# Altium footprint library PCB_Footprints.PcbLib: 303 footprints (part 4 of 19)
Each footprint in its own frame and in the unit in brackets; x right, y up, seen from the top. Pads: shape width x height; smd on the part's side, far side on the other; paste and mask are expansions set on the pad; w line width, h text height; cw(c..) or ccw(c..) is an arc to the next point about the centre after c.
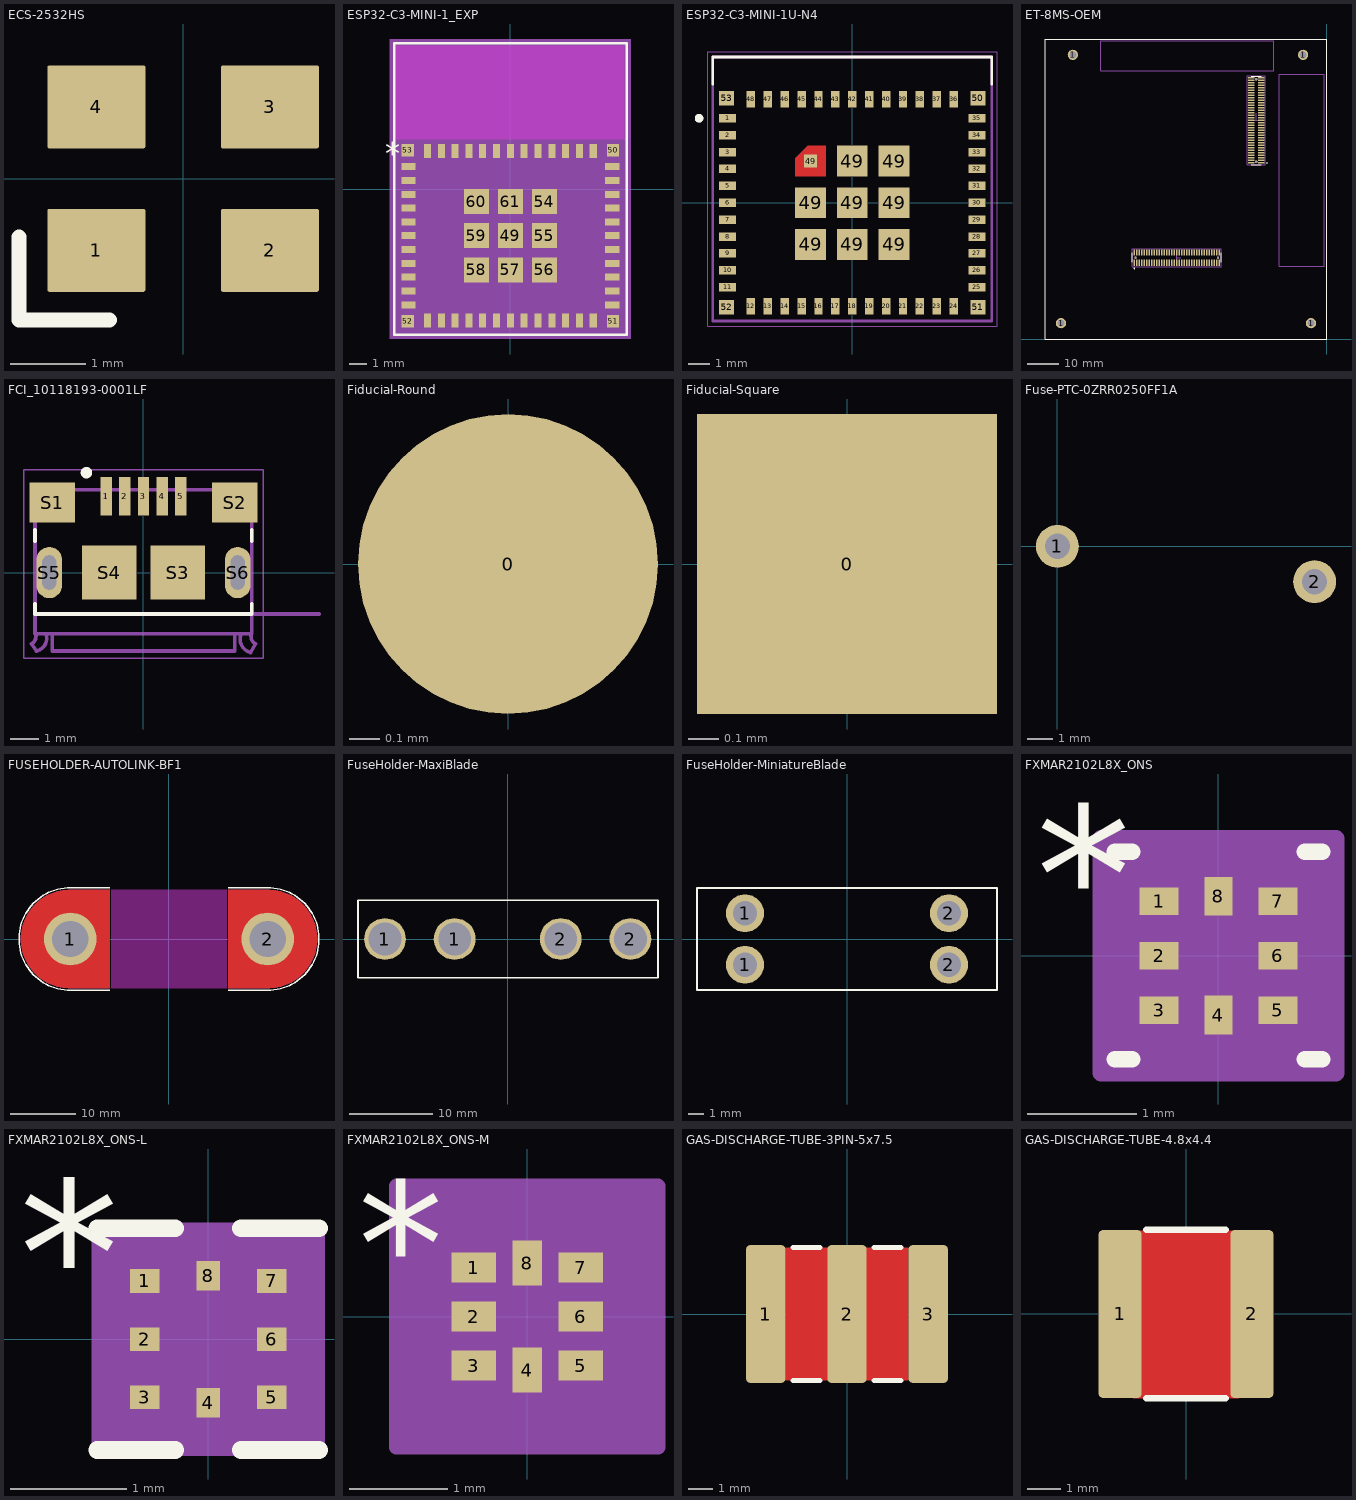
[diagram p3: the footprints below, top view; thin cyan lines are the x and y axes]

## ECS-2532HS [mm] "ECS-2532HS OSCILLATOR 3.2x2.5mm, from ECS model 2532HS datasheet"
height 1
pads (4):
  rrect5% 1.3x1.1 smd: 1(-1.15,-0.95) 2(1.15,-0.95) 3(1.15,0.95) 4(-1.15,0.95)
Top Overlay:
  lines w0.2: -2.175,-0.775 -2.175,-1.875 -0.975,-1.875
3D body: height 0.8, standoff 0.1, extent -1.6,-1.25 1.6,1.25

## ESP32-C3-MINI-1_EXP [mil]
pads (61):
  rect 32x16 smd paste+0 mask+0: 1(-232.28,50.98) 2(-232.28,19.48) 3(-232.28,-12.01) 4(-232.28,-43.51) 5(-232.28,-75) 6(-232.28,-106.5) 7(-232.28,-138) 8(-232.28,-169.49) 9(-232.28,-200.99) 10(-232.28,-232.48) 11(-232.28,-263.98) 25(232.28,-263.98) 26(232.28,-232.48) 27(232.28,-200.99) 28(232.28,-169.49) 29(232.28,-138) 30(232.28,-106.5) 31(232.28,-75) 32(232.28,-43.51) 33(232.28,-12.01) 34(232.28,19.48) 35(232.28,50.98)
  rect 16x32 smd paste+0 mask+0: 12(-188.98,-299.41) 13(-157.48,-299.41) 14(-125.98,-299.41) 15(-94.49,-299.41) 16(-62.99,-299.41) 17(-31.5,-299.41) 18(0,-299.41) 19(31.5,-299.41) 20(62.99,-299.41) 21(94.49,-299.41) 22(125.98,-299.41) 23(157.48,-299.41) 24(188.98,-299.41) 36(188.98,86.41) 37(157.48,86.41) 38(125.98,86.41) 39(94.49,86.41) 40(62.99,86.41) 41(31.5,86.41) 42(0,86.41) 43(-31.5,86.41) 44(-62.99,86.41) 45(-94.49,86.41) 46(-125.98,86.41) 47(-157.48,86.41) 48(-188.98,86.41)
  rect 57x57 smd: 49(0,-106.5) 54(77.76,-28.74) 55(77.76,-106.5) 56(77.76,-184.26) 57(0,-184.26) 58(-77.76,-184.26) 59(-77.76,-106.5) 60(-77.76,-28.74) 61(0,-28.74)
  rect 28x28 smd: 50(234.25,88.38) 51(234.25,-301.38) 52(-234.25,-301.38) 53(-234.25,88.38)
Top Overlay:
  lines w6: -265,-332 -265,332 265,332 265,-332 -265,-332
  text "*" at -285.78,56.73 h50
Keep-Out Layer:
  region: 260,327 -260,327 -260,114 260,114
Bottom 3D Body (Mech5):
  region: 275,342 -275,342 -275,-342 275,-342
Mechanical 13:
  lines w1: -260,-327 -260,327 260,327 260,-327 -260,-327
  text "*" at -218.78,41.73 h50
Mechanical 15:
  region: 270,337 -270,337 -270,-337 270,-337
  lines w6: -270,-337 -270,337 270,337 270,-337 -270,-337
3D body: height 10, standoff 0, extent 0,0 10,10
3D body "ESP32-C3-MINI.STEP": height 100.39, standoff 0, extent -258.86,-326.77 260.83,326.77

## ESP32-C3-MINI-1U-N4 [mm]
height 2.55
pads (61):
  rect 0.8x0.4 smd: 1(-5.9,4) 2(-5.9,3.2) 3(-5.9,2.4) 4(-5.9,1.6) 5(-5.9,0.8) 6(-5.9,0) 7(-5.9,-0.8) 8(-5.9,-1.6) 9(-5.9,-2.4) 10(-5.9,-3.2) 11(-5.9,-4) 25(5.9,-4) 26(5.9,-3.2) 27(5.9,-2.4) 28(5.9,-1.6) 29(5.9,-0.8) 30(5.9,0) 31(5.9,0.8) 32(5.9,1.6) 33(5.9,2.4) 34(5.9,3.2) 35(5.9,4)
  rect 0.4x0.8 smd: 12(-4.8,-4.9) 13(-4,-4.9) 14(-3.2,-4.9) 15(-2.4,-4.9) 16(-1.6,-4.9) 17(-0.8,-4.9) 18(0,-4.9) 19(0.8,-4.9) 20(1.6,-4.9) 21(2.4,-4.9) 22(3.2,-4.9) 23(4,-4.9) 24(4.8,-4.9) 36(4.8,4.9) 37(4,4.9) 38(3.2,4.9) 39(2.4,4.9) 40(1.6,4.9) 41(0.8,4.9) 42(0,4.9) 43(-0.8,4.9) 44(-1.6,4.9) 45(-2.4,4.9) 46(-3.2,4.9) 47(-4,4.9) 48(-4.8,4.9)
  rect 1.45x1.45 smd: 49(-1.975,-1.975) 49(-1.975,0) 49(0,-1.975) 49(0,0) 49(0,1.975) 49(1.975,-1.975) 49(1.975,0) 49(1.975,1.975)
  rect 0.6x0.6 smd paste-1 mask+0: 49(-1.975,1.975)
  rect 0.7x0.7 smd: 50(5.95,4.95) 51(5.95,-4.95) 52(-5.95,-4.95) 53(-5.95,4.95)
Top Layer:
  region: -1.25,1.25 -2.7,1.25 -2.7,2.1 -2.1,2.7 -1.25,2.7
Top Overlay:
  circle w0.2: c-7.25,4 r0.1
  lines w0.127: -6.6,5.62 -6.6,6.9 6.6,6.9 6.6,5.62
Top Paste:
  region: -1.25,1.25 -2.7,1.25 -2.7,2.1 -2.1,2.7 -1.25,2.7
Top Solder:
  region: -1.15,1.15 -2.8,1.15 -2.8,2.14 -2.14,2.8 -1.15,2.8
Mechanical 13:
  circle w0.2: c-7.25,4 r0.1
  lines w0.127: -6.6,-5.6 -6.6,6.9 6.6,6.9 6.6,-5.6 -6.6,-5.6
Mechanical 15:
  lines w0.05: -6.85,-5.85 6.85,-5.85 6.85,7.15 -6.85,7.15 -6.85,-5.85
3D body "step_temp.STEP": height 2.55, standoff 0, extent -6.6,-5.6 6.6,6.9

## ET-8MS-OEM [mm] "Switch Ethernet pour boite de jct ichtyos"
pads (148):
  round 3.302 hole 2.286: 1(-85.09,5.08) 1(-81.28,90.932) 1(-7.62,90.932) 1(-5.08,5.08)
  rect 2.03x0.508 smd: 1A(-20.956,83.552) 2A(-24.256,83.552) 3A(-20.956,82.752) 4A(-24.256,82.752) 5A(-20.956,81.952) 6A(-24.256,81.952) 7A(-20.956,81.152) 8A(-24.256,81.152) 9A(-20.956,80.352) 10A(-24.256,80.352) 11A(-20.956,79.552) 12A(-24.256,79.552) 13A(-20.956,78.752) 14A(-24.256,78.752) 15A(-20.956,77.952) 16A(-24.256,77.952) 17A(-20.956,77.152) 18A(-24.256,77.152) 19A(-20.956,76.352) 20A(-24.256,76.352) 21A(-20.956,75.552) 22A(-24.256,75.552) 23A(-20.956,74.752) 24A(-24.256,74.752) 25A(-20.956,73.952) 26A(-24.256,73.952) 27A(-20.956,73.152) 28A(-24.256,73.152) 29A(-20.956,72.352) 30A(-24.256,72.352) 31A(-20.956,71.552) 32A(-24.256,71.552) 33A(-20.956,70.752) 34A(-24.256,70.752) 35A(-20.956,69.952) 36A(-24.256,69.952) 37A(-20.956,69.152) 38A(-24.256,69.152) 39A(-20.956,68.352) 40A(-24.256,68.352) 41A(-20.956,67.552) 42A(-24.256,67.552) 43A(-20.956,66.752) 44A(-24.256,66.752) 45A(-20.956,65.952) 46A(-24.256,65.952) 47A(-20.956,65.152) 48A(-24.256,65.152) 49A(-20.956,64.352) 50A(-24.256,64.352) 51A(-20.956,63.552) 52A(-24.256,63.552) 53A(-20.956,62.752) 54A(-24.256,62.752) 55A(-20.956,61.952) 56A(-24.256,61.952) 57A(-20.956,61.152) 58A(-24.256,61.152) 59A(-20.956,60.352) 60A(-24.256,60.352) 61A(-20.956,59.552) 62A(-24.256,59.552) 63A(-20.956,58.752) 64A(-24.256,58.752) 65A(-20.956,57.952) 66A(-24.256,57.952) 67A(-20.956,57.152) 68A(-24.256,57.152) 69A(-20.956,56.352) 70A(-24.256,56.352)
  rect 0.508x2.03 smd: 1B(-34.431,24.385) 2B(-34.431,27.685) 3B(-35.231,24.385) 4B(-35.231,27.685) 5B(-36.031,24.385) 6B(-36.031,27.685) 7B(-36.831,24.385) 8B(-36.831,27.685) 9B(-37.631,24.385) 10B(-37.631,27.685) 11B(-38.431,24.385) 12B(-38.431,27.685) 13B(-39.231,24.385) 14B(-39.231,27.685) 15B(-40.031,24.385) 16B(-40.031,27.685) 17B(-40.831,24.385) 18B(-40.831,27.685) 19B(-41.631,24.385) 20B(-41.631,27.685) 21B(-42.431,24.385) 22B(-42.431,27.685) 23B(-43.231,24.385) 24B(-43.231,27.685) 25B(-44.031,24.385) 26B(-44.031,27.685) 27B(-44.831,24.385) 28B(-44.831,27.685) 29B(-45.631,24.385) 30B(-45.631,27.685) 31B(-46.431,24.385) 32B(-46.431,27.685) 33B(-47.231,24.385) 34B(-47.231,27.685) 35B(-48.031,24.385) 36B(-48.031,27.685) 37B(-48.831,24.385) 38B(-48.831,27.685) 39B(-49.631,24.385) 40B(-49.631,27.685) 41B(-50.431,24.385) 42B(-50.431,27.685) 43B(-51.231,24.385) 44B(-51.231,27.685) 45B(-52.031,24.385) 46B(-52.031,27.685) 47B(-52.831,24.385) 48B(-52.831,27.685) 49B(-53.631,24.385) 50B(-53.631,27.685) 51B(-54.431,24.385) 52B(-54.431,27.685) 53B(-55.231,24.385) 54B(-55.231,27.685) 55B(-56.031,24.385) 56B(-56.031,27.685) 57B(-56.831,24.385) 58B(-56.831,27.685) 59B(-57.631,24.385) 60B(-57.631,27.685) 61B(-58.431,24.385) 62B(-58.431,27.685) 63B(-59.231,24.385) 64B(-59.231,27.685) 65B(-60.031,24.385) 66B(-60.031,27.685) 67B(-60.831,24.385) 68B(-60.831,27.685) 69B(-61.631,24.385) 70B(-61.631,27.685)
  round 0.76 hole 0.76 unplated: ""(-61.231,26.035) ""(-34.831,26.035) ""(-22.606,56.752) ""(-22.606,83.152)
Top Overlay:
  circle w0.2: c-61.631,22.61 r0.1
  circle w0.2: c-19.181,56.352 r0.1
  lines w0.2: -62.235,24.511 -62.235,27.559 ; -33.827,24.511 -33.827,27.559 ; -24.13,55.748 -21.082,55.748 ; -24.13,84.156 -21.082,84.156
  lines w0.254: -90.17,0 0,0 0,96.012 -90.17,96.012 -90.17,0
Information:
  lines w0.254: -48.031,24.385 -48.031,27.685 ; -48.031,26.035 -46.761,26.035 ; -24.256,69.952 -20.956,69.952 ; -22.606,69.952 -22.606,72.2
Mechanical 13:
  lines w0.254: -72.4,85.9 -72.4,95.5 -17,95.5 -17,85.9 -72.4,85.9 ; -15.2,23.3 -0.87,23.3 -0.87,84.8 -15.2,84.8 -15.2,23.3
  text "Connecteur Molex LED" at -65.044,89.556 h2.03
  text "Connecteur Molex Eth" at -7.656,33.156 h2.03
Mechanical 15:
  lines w0.05: -62.281,23.12 -62.281,28.95 -33.781,28.95 -33.781,23.12 -62.281,23.12 ; -25.521,55.702 -19.691,55.702 -19.691,84.202 -25.521,84.202 -25.521,55.702
3D body "FTE-135-01-G-DV-A.step": height 3.7, standoff -0.62, extent -62.174,23.714 -34.17,28.286
3D body "FTE-135-01-G-DV-A.step": height 3.7, standoff -0.62, extent -24.892,55.95 -20.32,83.953
3D body: height 14.91, standoff 3.5, extent -15.2,23.3 -0.87,84.8
3D body: height 14.91, standoff 3.5, extent -72.4,85.9 -17,95.5
3D body: height 4.88, standoff 3.5, extent -90.17,0 0,96.012
3D body: height 14.91, standoff 3.48, extent -20,9.5 -1.5,15.5
3D body: height 10.34, standoff 3.48, extent -43,3.5 -25,19.5
3D body: height 12.62, standoff 3.48, extent -66.5,4 -46.5,17
3D body: height 14.91, standoff 3.48, extent -87,11.5 -83.5,65
3D body: height 11.86, standoff 3.48, extent -87.5,69 -78.5,81.5

## FCI_10118193-0001LF [mm]
pads (13):
  rect 0.4x1.35 smd: 1(-1.3,2.675) 2(-0.65,2.675) 3(0,2.675) 4(0.65,2.675) 5(1.3,2.675)
  rect 1.6x1.4 smd: S1(-3.2,2.45) S2(3.2,2.45)
  rect 1.9x1.9 smd: S3(1.2,0) S4(-1.2,0)
  oval 0.9x1.8 hole 0.5 slot 1.2 at 90 deg: S5(-3.3,0) S6(3.3,0)
  round 0.5 hole 0.5 unplated: ""(-3.3,0) ""(3.3,0)
Top Overlay:
  circle w0.2: c-2,3.5 r0.1
  lines w0.127: -3.8,-1.45 3.8,-1.45 ; -3.8,-1.4 -3.8,-1.1 ; -3.8,1.1 -3.8,1.5 ; 3.8,-1.4 3.8,-1.1 ; 3.8,1.1 3.8,1.5
Mechanical 13:
  lines w0.127: -3.93,-2.5 -3.75,-2.75 ; -3.93,-2.5 ccw(c-4.065,-2.235) -3.8,-2.1 ; -3.746,-2.749 ccw(c-3.85,-2.3) -3.401,-2.196 ; -3.2,-2.2 -3.2,-2.75 3.2,-2.75 3.2,-2.2 ; 3.401,-2.198 ccw(c3.875,-2.325) 3.748,-2.799 ; 3.75,-2.8 3.93,-2.5 ; 3.8,-2.1 ccw(c4.065,-2.235) 3.93,-2.5 ; 6.15,-1.45 3.8,-1.45 ; -3.8,-2.1 -3.8,-2.15 3.8,-2.15 3.8,-1.45 ; -3.8,-2.1 -3.8,2.9 3.8,2.9 3.8,-1.45
  text "PCB END" at 4.75,-1.3 h0.41
Mechanical 15:
  lines w0.05: -4.2,-3 -4.2,3.6 4.2,3.6 4.2,-3 -4.2,-3
3D body "step_temp.STEP": height 2.85, standoff -0.75, extent -3.93,-2.76 3.93,2.95

## Fiducial-Round [mm] "Round Fiducial Mark 1mm"
pads (1):
  round 1 smd paste-5 mask+0.5: 0(0,0)

## Fiducial-Square [mm] "Square Fiducial Mark 1mm"
pads (1):
  rect 1x1 smd paste-5 mask+0.5: 0(0,0)

## Fuse-PTC-0ZRR0250FF1A [mm] "PTC 0ZRR0250FF1A from Radial Leaded PTC 0ZRR Feb2018"
height 26.4
pads (2):
  round 1.7 hole 1: 1(0,0) 2(10.2,-1.4)
3D body: height 4, standoff -3.6, extent -0.402,-0.404 0.405,0.404
3D body: height 7, standoff 0, extent -0.992,-0.998 1,0.998
3D body: height 7, standoff 0, extent 9.208,-2.398 11.2,-0.402
3D body: height 4, standoff -3.6, extent 9.798,-1.804 10.605,-0.996
3D body: height 26.4, standoff 5.1, extent -5.55,-2.25 15.75,0.85

## FUSEHOLDER-AUTOLINK-BF1 [mm] "PCB based Holder for LittleFuse BF1-58 serie."
height 4.5
pads (2):
  round 8 hole 5.5: 1(-15,0) 2(15,0)
Top Layer:
  rectangle: -15,-7.5 -9,7.5
  region: 15,7.5 9,7.5 9,-7.5 15,-7.5
  region: -9,4.5 -9.256,4.841 -9.841,5.461 -10.493,6.01 -11.203,6.482 -11.962,6.87 -12.76,7.17 -13.587,7.378 -14.432,7.491 -15.284,7.507 -16.133,7.426 -16.967,7.25 -17.776,6.98 -18.549,6.621 -19.276,6.176 -19.949,5.652 -20.557,5.055 -21.094,4.392 -21.552,3.674 -21.926,2.908 -22.211,2.104 -22.403,1.273 -22.5,0.426 -22.5,-0.426 -22.403,-1.273 -22.211,-2.104 -21.926,-2.907 -21.552,-3.674 -21.094,-4.392 -20.557,-5.055 -19.949,-5.652 -19.276,-6.176 -18.549,-6.621 -17.776,-6.98 -16.967,-7.25 -16.133,-7.426 -15.284,-7.507 -14.432,-7.491 -13.587,-7.378 -12.76,-7.17 -11.962,-6.87 -11.203,-6.482 -10.493,-6.01 -9.841,-5.461 -9.256,-4.841 -9,-4.5
  region: 9,-4.5 9.256,-4.841 9.841,-5.461 10.493,-6.01 11.203,-6.482 11.962,-6.87 12.76,-7.17 13.587,-7.378 14.432,-7.491 15.284,-7.507 16.133,-7.426 16.967,-7.25 17.776,-6.98 18.549,-6.621 19.276,-6.176 19.949,-5.652 20.557,-5.055 21.094,-4.392 21.553,-3.674 21.927,-2.908 22.211,-2.104 22.403,-1.273 22.5,-0.426 22.5,0.426 22.403,1.273 22.211,2.104 21.927,2.908 21.553,3.674 21.094,4.392 20.557,5.055 19.949,5.652 19.276,6.176 18.549,6.621 17.776,6.98 16.967,7.25 16.133,7.426 15.284,7.507 14.432,7.491 13.587,7.378 12.76,7.17 11.962,6.87 11.203,6.482 10.493,6.01 9.841,5.461 9.256,4.841 9,4.5
Bottom Layer:
  region: 15,7.5 9,7.5 9,-7.5 15,-7.5
  rectangle: -15,-7.5 -9,7.5
  region: 9,-4.5 9.256,-4.841 9.841,-5.461 10.493,-6.01 11.203,-6.482 11.962,-6.87 12.76,-7.17 13.587,-7.378 14.432,-7.491 15.284,-7.507 16.133,-7.426 16.967,-7.25 17.776,-6.98 18.549,-6.621 19.276,-6.176 19.949,-5.652 20.557,-5.055 21.094,-4.392 21.553,-3.674 21.927,-2.908 22.211,-2.104 22.403,-1.273 22.5,-0.426 22.5,0.426 22.403,1.273 22.211,2.104 21.927,2.908 21.553,3.674 21.094,4.392 20.557,5.055 19.949,5.652 19.276,6.176 18.549,6.621 17.776,6.98 16.967,7.25 16.133,7.426 15.284,7.507 14.432,7.491 13.587,7.378 12.76,7.17 11.962,6.87 11.203,6.482 10.493,6.01 9.841,5.461 9.256,4.841 9,4.5
  region: -9,4.5 -9.256,4.841 -9.841,5.461 -10.493,6.01 -11.203,6.482 -11.962,6.87 -12.76,7.17 -13.587,7.378 -14.432,7.491 -15.284,7.507 -16.133,7.426 -16.967,7.25 -17.776,6.98 -18.549,6.621 -19.276,6.176 -19.949,5.652 -20.557,5.055 -21.094,4.392 -21.552,3.674 -21.926,2.908 -22.211,2.104 -22.403,1.273 -22.5,0.426 -22.5,-0.426 -22.403,-1.273 -22.211,-2.104 -21.926,-2.907 -21.552,-3.674 -21.094,-4.392 -20.557,-5.055 -19.949,-5.652 -19.276,-6.176 -18.549,-6.621 -17.776,-6.98 -16.967,-7.25 -16.133,-7.426 -15.284,-7.507 -14.432,-7.491 -13.587,-7.378 -12.76,-7.17 -11.962,-6.87 -11.203,-6.482 -10.493,-6.01 -9.841,-5.461 -9.256,-4.841 -9,-4.5
Top Overlay:
  lines w0.2: -9,-7.8 -15,-7.8 cw(c-15,0) -15,7.8 -9,7.8 ; 9,-7.8 15,-7.8 ccw(c15,0) 15,7.8 9,7.8
Top Solder:
  rectangle: -15,-7.5 -9,7.5
  region: 15,7.5 9,7.5 9,-7.5 15,-7.5
  region: -9,4.5 -9.256,4.841 -9.841,5.461 -10.493,6.01 -11.203,6.482 -11.962,6.87 -12.76,7.17 -13.587,7.378 -14.432,7.491 -15.284,7.507 -16.133,7.426 -16.967,7.25 -17.776,6.98 -18.549,6.621 -19.276,6.176 -19.949,5.652 -20.557,5.055 -21.094,4.392 -21.552,3.674 -21.926,2.908 -22.211,2.104 -22.403,1.273 -22.5,0.426 -22.5,-0.426 -22.403,-1.273 -22.211,-2.104 -21.926,-2.907 -21.552,-3.674 -21.094,-4.392 -20.557,-5.055 -19.949,-5.652 -19.276,-6.176 -18.549,-6.621 -17.776,-6.98 -16.967,-7.25 -16.133,-7.426 -15.284,-7.507 -14.432,-7.491 -13.587,-7.378 -12.76,-7.17 -11.962,-6.87 -11.203,-6.482 -10.493,-6.01 -9.841,-5.461 -9.256,-4.841 -9,-4.5
  region: 9,-4.5 9.256,-4.841 9.841,-5.461 10.493,-6.01 11.203,-6.482 11.962,-6.87 12.76,-7.17 13.587,-7.378 14.432,-7.491 15.284,-7.507 16.133,-7.426 16.967,-7.25 17.776,-6.98 18.549,-6.621 19.276,-6.176 19.949,-5.652 20.557,-5.055 21.094,-4.392 21.553,-3.674 21.927,-2.908 22.211,-2.104 22.403,-1.273 22.5,-0.426 22.5,0.426 22.403,1.273 22.211,2.104 21.927,2.908 21.553,3.674 21.094,4.392 20.557,5.055 19.949,5.652 19.276,6.176 18.549,6.621 17.776,6.98 16.967,7.25 16.133,7.426 15.284,7.507 14.432,7.491 13.587,7.378 12.76,7.17 11.962,6.87 11.203,6.482 10.493,6.01 9.841,5.461 9.256,4.841 9,4.5
Bottom Solder:
  region: 15,7.5 9,7.5 9,-7.5 15,-7.5
  rectangle: -15,-7.5 -9,7.5
  region: 9,-4.5 9.256,-4.841 9.841,-5.461 10.493,-6.01 11.203,-6.482 11.962,-6.87 12.76,-7.17 13.587,-7.378 14.432,-7.491 15.284,-7.507 16.133,-7.426 16.967,-7.25 17.776,-6.98 18.549,-6.621 19.276,-6.176 19.949,-5.652 20.557,-5.055 21.094,-4.392 21.552,-3.674 21.927,-2.908 22.211,-2.104 22.403,-1.273 22.5,-0.426 22.5,0.426 22.403,1.273 22.211,2.104 21.927,2.907 21.552,3.674 21.094,4.392 20.557,5.055 19.949,5.652 19.276,6.176 18.549,6.621 17.776,6.98 16.967,7.25 16.133,7.426 15.284,7.507 14.432,7.491 13.587,7.378 12.76,7.17 11.962,6.87 11.203,6.482 10.493,6.01 9.841,5.461 9.256,4.841 9,4.5
  region: -9,4.5 -9.256,4.841 -9.841,5.461 -10.493,6.01 -11.203,6.482 -11.962,6.87 -12.76,7.17 -13.587,7.378 -14.432,7.491 -15.284,7.507 -16.133,7.426 -16.967,7.25 -17.776,6.98 -18.549,6.621 -19.276,6.176 -19.949,5.652 -20.557,5.055 -21.094,4.392 -21.553,3.674 -21.927,2.908 -22.211,2.104 -22.403,1.273 -22.5,0.426 -22.5,-0.426 -22.403,-1.273 -22.211,-2.104 -21.927,-2.908 -21.553,-3.674 -21.094,-4.392 -20.557,-5.055 -19.949,-5.652 -19.276,-6.176 -18.549,-6.621 -17.776,-6.98 -16.967,-7.25 -16.133,-7.426 -15.284,-7.507 -14.432,-7.491 -13.587,-7.378 -12.76,-7.17 -11.962,-6.87 -11.203,-6.482 -10.493,-6.01 -9.841,-5.461 -9.256,-4.841 -9,-4.5
Keep-Out Layer:
  board cut-out: -8.8,7.5 -8.8,-7.5 8.8,-7.5 8.8,7.5
3D body: height 0.6, standoff 0, extent -21,-6 -9,6
3D body: height 0.6, standoff 0, extent 9,-6 21,6
3D body: height 0.6, standoff 0, extent -15,-6 15,6
3D body: height 4, standoff -2, extent -8,-6 8,6
3D body: height 8, standoff -4, extent -5,-6 5,6

## FuseHolder-MaxiBlade [mm] "Keystone 3555-2 Maxi Blade Fuse Holder"
height 35.6
pads (4):
  round 5 hole 3.9: 1(-14.68,0) 1(-6.35,0) 2(6.35,0) 2(14.68,0)
Top Overlay:
  lines w0.2: -17.907,-4.623 17.975,-4.623 17.975,4.623 -14.694,4.623 -17.907,4.623 -17.907,-4.623
3D body "keystone-PN3555-2.STEP": height 11.24, standoff -3.44, extent -17.907,-3.396 17.907,2.446
3D body "User Library-Bussmann MAXI.step": height 37, standoff 2.12, extent -14.694,-4.623 14.694,4.623

## FuseHolder-MiniatureBlade [mm] "Keystone 3557-2 Miniature Blade Fuse Holder"
height 7.37
pads (4):
  round 2.5 hole 1.6: 1(-6.735,-1.7) 1(-6.735,1.7) 2(6.735,-1.7) 2(6.735,1.7)
Top Overlay:
  lines w0.15: -9.905,-3.365 -9.905,3.365 9.905,3.365 9.905,-3.365 -9.905,-3.365
3D body "User Library-MINI BUSSMAN FUSE.step": height 16.65, standoff 0.01, extent -5.685,-2.009 5.135,1.75
3D body "keystone-PN3557-2.STEP": height 7.38, standoff -2.78, extent -9.909,-3.308 9.903,3.423

## FXMAR2102L8X_ONS [mil]
pads (8):
  rect 14x10 smd paste+0 mask+0: 1(-21.5,19.69) 2(-21.5,0) 3(-21.5,-19.69) 5(21.5,-19.69) 6(21.5,0) 7(21.5,19.69)
  rect 10x14 smd paste+0 mask+0: 4(0,-21.5) 8(0,21.5)
Top Overlay:
  lines w6: -37.5,-37.5 -31.24,-37.5 ; -37.5,37.5 -31.24,37.5 ; 31.24,-37.5 37.5,-37.5 ; 31.24,37.5 37.5,37.5
  text "*" at -66,4.54 h50
Mechanical 13:
  lines w1: -32.5,-17.5 17.5,32.5 ; -32.5,-32.5 -32.5,32.5 32.5,32.5 32.5,-32.5 -32.5,-32.5 ; -32.5,-24.69 -28.5,-24.69 -28.5,-14.69 -32.5,-14.69 -32.5,-24.69 ; -32.5,-5 -28.5,-5 -28.5,5 -32.5,5 -32.5,-5 ; -32.5,14.69 -28.5,14.69 -28.5,24.69 -32.5,24.69 -32.5,14.69 ; -5,-32.5 -5,-28.5 5,-28.5 5,-32.5 -5,-32.5 ; -5,28.5 -5,32.5 5,32.5 5,28.5 -5,28.5 ; 28.5,-24.69 28.5,-14.69 32.5,-14.69 32.5,-24.69 28.5,-24.69 ; 28.5,-5 28.5,5 32.5,5 32.5,-5 28.5,-5 ; 28.5,14.69 28.5,24.69 32.5,24.69 32.5,14.69 28.5,14.69
  text "*" at -27,4.54 h50
Mechanical 15:
  region: -15,-42.5 -42.5,-42.5 -42.5,-34.69 -42.5,34.69 -42.5,42.5 -15,42.5 15,42.5 42.5,42.5 42.5,34.69 42.5,-34.69 42.5,-42.5 15,-42.5
  lines w6: -42.5,-42.5 -15,-42.5 15,-42.5 42.5,-42.5 42.5,-34.69 42.5,34.69 42.5,42.5 15,42.5 -15,42.5 -42.5,42.5 -42.5,34.69 -42.5,-34.69 -42.5,-42.5
3D body "FXMAR2102L8X_ONS.step": height 22.09, standoff 0, extent -32.52,-32.52 32.52,32.52

## FXMAR2102L8X_ONS-L [mil]
pads (8):
  rect 10x8 smd paste+0 mask+0: 1(-21.5,19.69) 2(-21.5,0) 3(-21.5,-19.69) 5(21.5,-19.69) 6(21.5,0) 7(21.5,19.69)
  rect 8x10 smd paste+0 mask+0: 4(0,-21.5) 8(0,21.5)
Top Overlay:
  lines w6: -37.5,-37.5 -11.11,-37.5 ; -37.5,37.5 -11.11,37.5 ; 11.11,-37.5 37.5,-37.5 ; 11.11,37.5 37.5,37.5
  text "*" at -64,4.54 h50
Mechanical 13:
  lines w1: -32.5,-17.5 17.5,32.5 ; -32.5,-32.5 32.5,-32.5 32.5,32.5 -32.5,32.5 -32.5,-32.5 ; -32.5,-24.69 -32.5,-14.69 -28.5,-14.69 -28.5,-24.69 -32.5,-24.69 ; -32.5,-5 -32.5,5 -28.5,5 -28.5,-5 -32.5,-5 ; -32.5,14.69 -32.5,24.69 -28.5,24.69 -28.5,14.69 -32.5,14.69 ; -5,-32.5 5,-32.5 5,-28.5 -5,-28.5 -5,-32.5 ; -5,28.5 5,28.5 5,32.5 -5,32.5 -5,28.5 ; 28.5,-24.69 32.5,-24.69 32.5,-14.69 28.5,-14.69 28.5,-24.69 ; 28.5,-5 32.5,-5 32.5,5 28.5,5 28.5,-5 ; 28.5,14.69 32.5,14.69 32.5,24.69 28.5,24.69 28.5,14.69
  text "*" at -29,4.54 h50
Mechanical 15:
  region: -8,-36.5 -36.5,-36.5 -36.5,-27.69 -36.5,27.69 -36.5,36.5 -8,36.5 8,36.5 36.5,36.5 36.5,27.69 36.5,-27.69 36.5,-36.5 8,-36.5
  lines w6: -36.5,-36.5 -36.5,-27.69 -36.5,27.69 -36.5,36.5 -8,36.5 8,36.5 36.5,36.5 36.5,27.69 36.5,-27.69 36.5,-36.5 8,-36.5 -8,-36.5 -36.5,-36.5
3D body "FXMAR2102L8X_ONS.step": height 22.09, standoff 0, extent -32.52,-32.52 32.52,32.52

## FXMAR2102L8X_ONS-M [mil]
pads (8):
  rect 18x12 smd paste+0 mask+0: 1(-21.5,19.69) 2(-21.5,0) 3(-21.5,-19.69) 5(21.5,-19.69) 6(21.5,0) 7(21.5,19.69)
  rect 12x18 smd paste+0 mask+0: 4(0,-21.5) 8(0,21.5)
Top Overlay:
  text "*" at -68,4.54 h50
Mechanical 13:
  lines w1: -32.5,-17.5 17.5,32.5 ; -32.5,-32.5 32.5,-32.5 32.5,32.5 -32.5,32.5 -32.5,-32.5 ; -32.5,-24.69 -32.5,-14.69 -28.5,-14.69 -28.5,-24.69 -32.5,-24.69 ; -32.5,-5 -32.5,5 -28.5,5 -28.5,-5 -32.5,-5 ; -32.5,14.69 -32.5,24.69 -28.5,24.69 -28.5,14.69 -32.5,14.69 ; -5,-32.5 5,-32.5 5,-28.5 -5,-28.5 -5,-32.5 ; -5,28.5 5,28.5 5,32.5 -5,32.5 -5,28.5 ; 28.5,-24.69 32.5,-24.69 32.5,-14.69 28.5,-14.69 28.5,-24.69 ; 28.5,-5 32.5,-5 32.5,5 28.5,5 28.5,-5 ; 28.5,14.69 32.5,14.69 32.5,24.69 28.5,24.69 28.5,14.69
  text "*" at -25,4.54 h50
Mechanical 15:
  region: -26,-52.5 -52.5,-52.5 -52.5,-45.69 -52.5,45.69 -52.5,52.5 -26,52.5 26,52.5 52.5,52.5 52.5,45.69 52.5,-45.69 52.5,-52.5 26,-52.5
  lines w6: -52.5,-52.5 -52.5,-45.69 -52.5,45.69 -52.5,52.5 -26,52.5 26,52.5 52.5,52.5 52.5,45.69 52.5,-45.69 52.5,-52.5 26,-52.5 -26,-52.5 -52.5,-52.5
3D body "FXMAR2102L8X_ONS.step": height 22.09, standoff 0, extent -32.52,-32.52 32.52,32.52

## GAS-DISCHARGE-TUBE-3PIN-5x7.5 [mm] "Gas Discharge Tube 5mm Diameter x 7.5mm Lengthfrom Bourns 2038-xx-SM, datasheet Rev N 05/18"
height 5
pads (3):
  rrect20% 1.6x5.6 smd: 1(-3.3,0) 2(0,0) 3(3.3,0)
Top Layer:
  pour cut-out: -2.5,2.7 2.5,2.7 2.5,-2.7 -2.5,-2.7
Top Overlay:
  lines w0.2: -2.2,-2.7 -1.1,-2.7 ; -2.2,2.7 -1.1,2.7 ; 1.1,-2.7 2.2,-2.7 ; 1.1,2.7 2.2,2.7
3D body "2038-xx-sm.stp": height 5.01, standoff 0.01, extent -3.85,-2.5 3.65,2.5
3D body "2038-xx-sm.stp": height 5.01, standoff 0.01, extent -3.65,-2.5 3.85,2.5

## GAS-DISCHARGE-TUBE-4.8x4.4 [mm] "Gas Discharge Tube 4.8mm Diameter x 4.4mm Lengthfrom Bourns 2039-xx-SM, datasheet Rev F 09/09"
height 5
pads (2):
  rrect20% 1.3x5.1 smd: 1(-2,0) 2(2,0)
Top Layer:
  pour cut-out: -1.6,2.525 1.6,2.525 1.6,-2.55 -1.6,-2.55
Top Overlay:
  lines w0.2: -1.2,-2.55 1.2,-2.55 ; -1.2,2.55 1.2,2.55
3D body "2039-xx-sm.stp": height 5.02, standoff 0.01, extent -2.201,-2.5 2.201,2.5
3D body "2039-xx-sm.stp": height 5.02, standoff 0.01, extent -2.201,-2.5 2.201,2.5